# Altium footprint library Other.PcbLib: 104 footprints (part 4 of 7)
Each footprint in its own frame and in the unit in brackets; x right, y up, seen from the top. Pads: shape width x height; smd on the part's side, far side on the other; paste and mask are expansions set on the pad; w line width, h text height; cw(c..) or ccw(c..) is an arc to the next point about the centre after c.
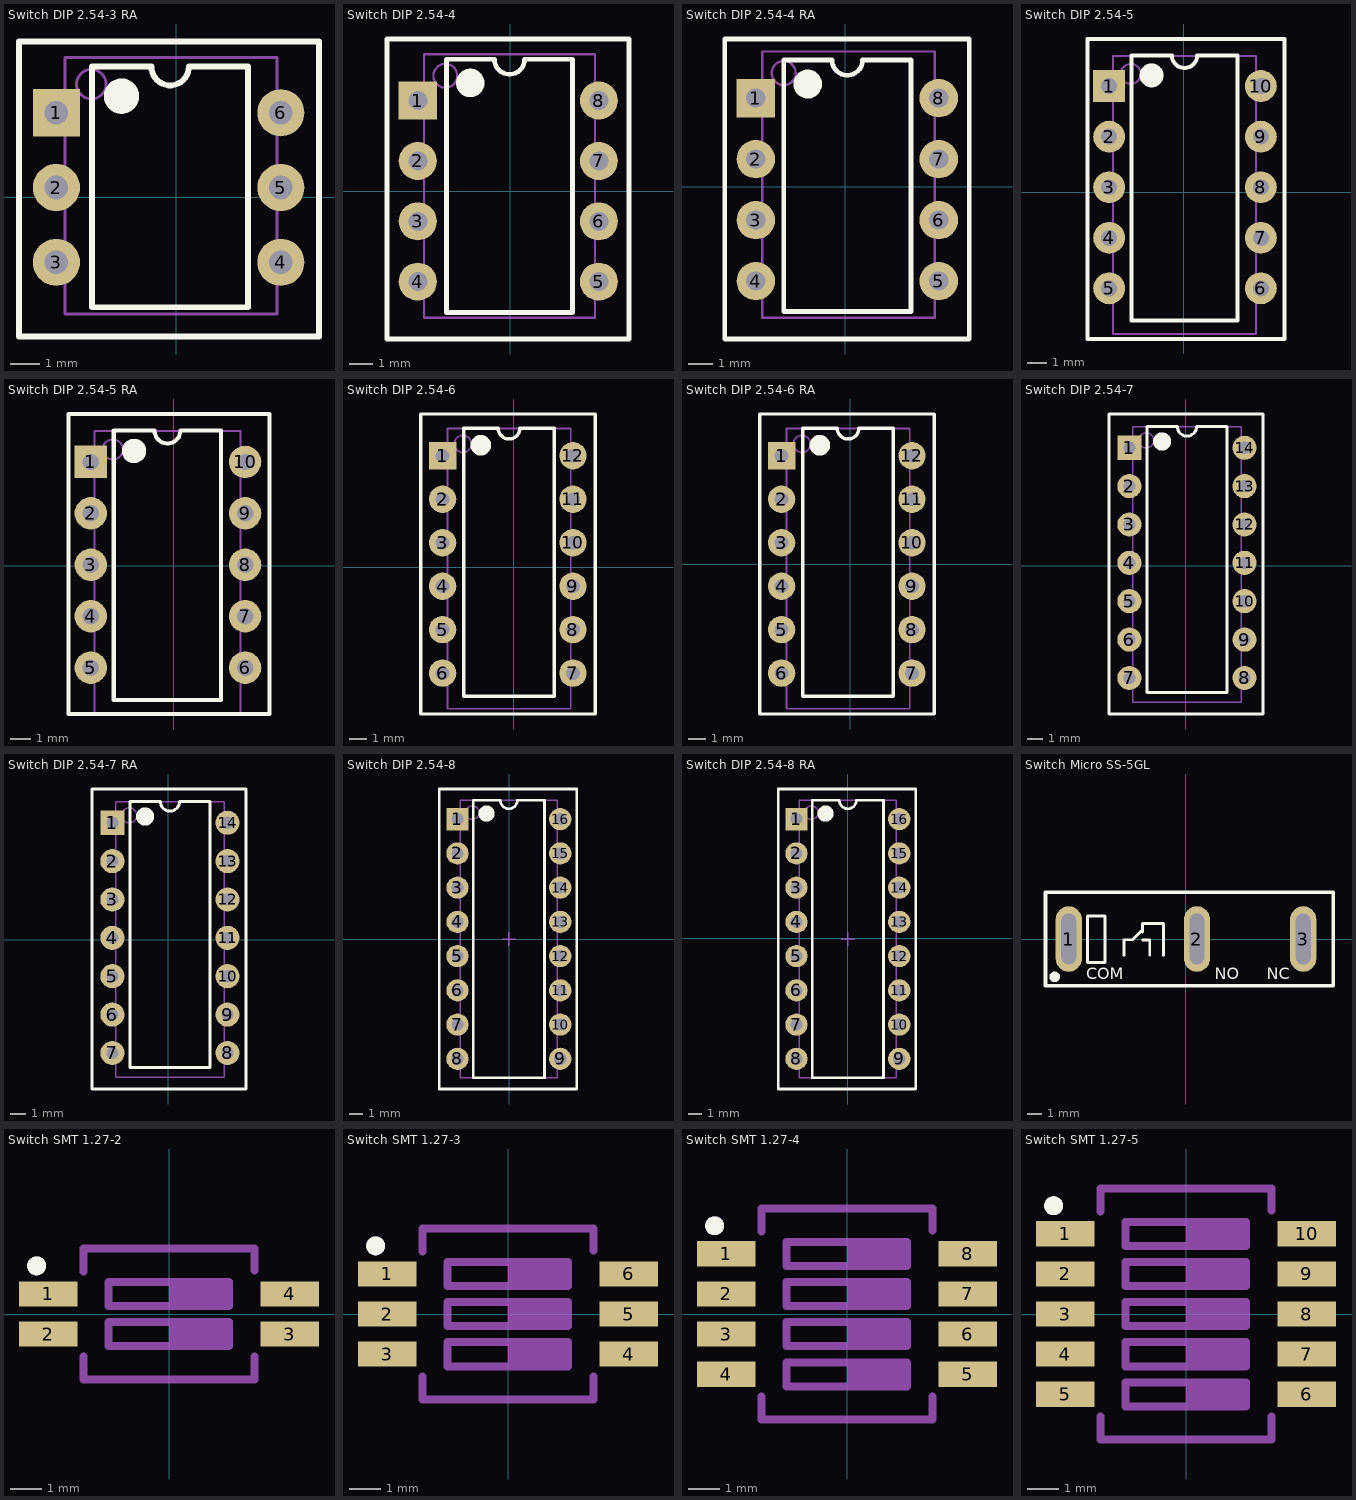
[diagram p3: the footprints below, top view; thin cyan lines are the x and y axes]

## Switch DIP 2.54-3 RA [mm] "3位拨码开关"
pads (6):
  rect 1.6x1.6 hole 0.8: 1(-4.064,2.87)
  round 1.6 hole 0.8: 2(-4.064,0.33) 3(-4.064,-2.21) 4(3.556,-2.21) 5(3.556,0.33) 6(3.556,2.87)
Top Overlay:
  circle w0.6: c-1.853,3.433 r0.3
  lines w0.2: -2.853,-3.734 -2.853,4.433 -0.838,4.433 ccw(c-0.203,4.433) 0.432,4.433 2.447,4.433 2.447,-3.734 -2.853,-3.734
  lines w0.203: -5.334,-4.496 -5.334,5.283 4.851,5.283 4.851,-4.496 ; -5.334,-4.445 -5.334,-4.724 4.851,-4.724 4.851,-3.886
Mechanical 13:
  circle w0.1: c-2.878,3.838 r0.5
  lines w0.1: -3.778,-3.962 -3.778,4.738 3.422,4.738 3.422,-3.962 -3.778,-3.962
3D body "User Library-DIP SW 3P TH RA.step": height 7.9, standoff -3.8, extent -6.258,-4.57 4.661,5.23

## Switch DIP 2.54-4 [mm] "2位拨码开关"
pads (8):
  rect 1.6x1.6 hole 0.8: 1(-3.886,3.81)
  round 1.6 hole 0.8: 2(-3.886,1.27) 3(-3.886,-1.27) 4(-3.886,-3.81) 5(3.734,-3.81) 6(3.734,-1.27) 7(3.734,1.27) 8(3.734,3.81)
Top Overlay:
  circle w0.6: c-1.675,4.55 r0.3
  lines w0.2: -2.675,-5.105 -2.675,5.55 -0.66,5.55 ccw(c-0.025,5.55) 0.61,5.55 2.625,5.55 2.625,-5.105 -2.675,-5.105
  lines w0.203: -5.182,-3.48 -5.182,6.401 5.004,6.401 5.004,-3.48 ; -5.182,-3.429 -5.182,-6.223 5.004,-6.223 5.004,-2.87
Mechanical 13:
  circle w0.1: c-2.725,4.854 r0.5
  lines w0.1: -3.625,-5.334 -3.625,5.754 3.575,5.754 3.575,-5.334 -3.625,-5.334
3D body "User Library-DIP SW 4P TH.step": height 8.5, standoff -3.8, extent -4.966,-6.159 4.814,6.261

## Switch DIP 2.54-4 RA [mm] "4位拨码开关"
pads (8):
  rect 1.6x1.6 hole 0.8: 1(-3.734,3.683)
  round 1.6 hole 0.8: 2(-3.734,1.143) 3(-3.734,-1.397) 4(-3.734,-3.937) 5(3.886,-3.937) 6(3.886,-1.397) 7(3.886,1.143) 8(3.886,3.683)
Top Overlay:
  circle w0.6: c-1.574,4.271 r0.3
  lines w0.2: -2.574,-5.207 2.726,-5.207 2.726,5.271 0.711,5.271 cw(c0.076,5.271) -0.559,5.271 -2.574,5.271 -2.574,-5.207
  lines w0.203: -5.029,-3.607 -5.029,6.147 5.156,6.147 5.156,-3.607 ; -5.029,-3.556 -5.029,-6.35 5.156,-6.35 5.156,-2.997
Mechanical 13:
  circle w0.1: c-2.573,4.727 r0.5
  lines w0.1: -3.473,-5.461 3.727,-5.461 3.727,5.627 -3.473,5.627 -3.473,-5.461
3D body "User Library-DIP SW 4P TH RA.step": height 7.9, standoff -3.8, extent -5.954,-6.297 4.966,6.043

## Switch DIP 2.54-5 [mm] "2位拨码开关"
pads (10):
  rect 1.6x1.6 hole 0.8: 1(-3.759,5.334)
  round 1.6 hole 0.8: 2(-3.759,2.794) 3(-3.759,0.254) 4(-3.759,-2.286) 5(-3.759,-4.826) 6(3.861,-4.826) 7(3.861,-2.286) 8(3.861,0.254) 9(3.861,2.794) 10(3.861,5.334)
Top Overlay:
  circle w0.6: c-1.625,5.871 r0.3
  lines w0.2: -2.625,-6.426 -2.625,6.871 -0.61,6.871 ccw(c0.025,6.871) 0.66,6.871 2.675,6.871 2.675,-6.426 -2.625,-6.426
  lines w0.203: 5.055,-2.388 5.055,7.696 -4.851,7.696 -4.851,-7.366 5.055,-7.366 5.055,-1.778
Mechanical 13:
  circle w0.1: c-2.675,5.946 r0.5
  lines w0.1: -3.575,-7.112 -3.575,6.846 3.625,6.846 3.625,-7.112 -3.575,-7.112
3D body "User Library-DIP SW 5P TH.step": height 8.5, standoff -3.8, extent -4.814,-7.302 4.966,7.658

## Switch DIP 2.54-5 RA [mm] "5位拨码开关"
pads (10):
  rect 1.6x1.6 hole 0.8: 1(-4.089,5.131)
  round 1.6 hole 0.8: 2(-4.089,2.591) 3(-4.089,0.051) 4(-4.089,-2.489) 5(-4.089,-5.029) 6(3.531,-5.029) 7(3.531,-2.489) 8(3.531,0.051) 9(3.531,2.591) 10(3.531,5.131)
Top Overlay:
  circle w0.6: c-1.955,5.668 r0.3
  lines w0.2: -2.955,-6.629 2.345,-6.629 2.345,6.668 0.33,6.668 cw(c-0.305,6.668) -0.94,6.668 -2.955,6.668 -2.955,-6.629
  lines w0.203: 4.724,-2.591 4.724,7.493 -5.182,7.493 -5.182,-7.313 4.724,-7.313 4.724,-1.981
Mechanical 13:
  circle w0.1: c-3.005,5.743 r0.5
  lines w0.1: -3.905,-7.315 3.295,-7.315 3.295,6.643 -3.905,6.643 -3.905,-7.315
3D body "User Library-DIP SW 5P TH RA.step": height 7.9, standoff -3.8, extent -6.335,-7.313 4.585,7.567

## Switch DIP 2.54-6 [mm] "2位拨码开关"
pads (12):
  rect 1.6x1.6 hole 0.8: 1(-4.166,6.502)
  round 1.6 hole 0.8: 2(-4.166,3.962) 3(-4.166,1.422) 4(-4.166,-1.118) 5(-4.166,-3.658) 6(-4.166,-6.198) 7(3.454,-6.198) 8(3.454,-3.658) 9(3.454,-1.118) 10(3.454,1.422) 11(3.454,3.962) 12(3.454,6.502)
Top Overlay:
  circle w0.6: c-1.929,7.116 r0.3
  lines w0.2: -2.929,-7.544 -2.929,8.116 -0.914,8.116 ccw(c-0.279,8.116) 0.356,8.116 2.371,8.116 2.371,-7.544 -2.929,-7.544
  lines w0.203: -5.436,-1.143 -5.436,8.941 4.75,8.941 4.75,-1.143 ; -5.436,-1.092 -5.436,-8.585 4.75,-8.585 4.75,-0.533
Mechanical 13:
  circle w0.1: c-2.979,7.191 r0.5
  lines w0.1: -3.879,-8.28 -3.879,8.091 3.321,8.091 3.321,-8.28 -3.879,-8.28
3D body "User Library-DIP SW 6P TH.step": height 8.5, standoff -3.8, extent -5.246,-8.598 4.534,8.902

## Switch DIP 2.54-6 RA [mm] "6位拨码开关"
pads (12):
  rect 1.6x1.6 hole 0.8: 1(-4.013,6.325)
  round 1.6 hole 0.8: 2(-4.013,3.785) 3(-4.013,1.245) 4(-4.013,-1.295) 5(-4.013,-3.835) 6(-4.013,-6.375) 7(3.607,-6.375) 8(3.607,-3.835) 9(3.607,-1.295) 10(3.607,1.245) 11(3.607,3.785) 12(3.607,6.325)
Top Overlay:
  circle w0.6: c-1.777,6.938 r0.3
  lines w0.2: -2.777,-7.722 2.523,-7.722 2.523,7.938 0.508,7.938 cw(c-0.127,7.938) -0.762,7.938 -2.777,7.938 -2.777,-7.722
  lines w0.203: -5.283,-1.321 -5.283,8.763 4.902,8.763 4.902,-1.321 ; -5.283,-1.27 -5.283,-8.763 4.902,-8.763 4.902,-0.711
Mechanical 13:
  circle w0.1: c-2.827,7.013 r0.5
  lines w0.1: -3.727,-8.458 3.473,-8.458 3.473,7.913 -3.727,7.913 -3.727,-8.458
3D body "User Library-DIP SW 6P TH RA.step": height 7.9, standoff -3.8, extent -6.233,-8.71 4.687,8.71

## Switch DIP 2.54-7 [mm] "2位拨码开关"
pads (14):
  rect 1.6x1.6 hole 0.8: 1(-3.734,7.823)
  round 1.6 hole 0.8: 2(-3.734,5.283) 3(-3.734,2.743) 4(-3.734,0.203) 5(-3.734,-2.337) 6(-3.734,-4.877) 7(-3.734,-7.417) 8(3.886,-7.417) 9(3.886,-4.877) 10(3.886,-2.337) 11(3.886,0.203) 12(3.886,2.743) 13(3.886,5.283) 14(3.886,7.823)
Top Overlay:
  circle w0.6: c-1.574,8.233 r0.3
  lines w0.2: -2.574,-8.382 -2.574,9.233 -0.559,9.233 ccw(c0.076,9.233) 0.711,9.233 2.726,9.233 2.726,-8.382 -2.574,-8.382
  lines w0.203: -5.08,-0.025 -5.08,10.058 5.105,10.058 5.105,-0.025 ; -5.08,0.025 -5.08,-9.804 5.105,-9.804 5.105,0.584
Mechanical 13:
  circle w0.1: c-2.624,8.308 r0.5
  lines w0.1: -3.524,-9.042 -3.524,9.208 3.676,9.208 3.676,-9.042 -3.524,-9.042
3D body "User Library-DIP SW 7P TH.step": height 8.5, standoff -3.8, extent -4.788,-9.791 4.992,10.249

## Switch DIP 2.54-7 RA [mm] "7位拨码开关"
pads (14):
  rect 1.6x1.6 hole 0.8: 1(-3.683,7.747)
  round 1.6 hole 0.8: 2(-3.683,5.207) 3(-3.683,2.667) 4(-3.683,0.127) 5(-3.683,-2.413) 6(-3.683,-4.953) 7(-3.683,-7.493) 8(3.937,-7.493) 9(3.937,-4.953) 10(3.937,-2.413) 11(3.937,0.127) 12(3.937,2.667) 13(3.937,5.207) 14(3.937,7.747)
Top Overlay:
  circle w0.6: c-1.523,8.157 r0.3
  lines w0.2: -2.523,-8.458 2.777,-8.458 2.777,9.157 0.762,9.157 cw(c0.127,9.157) -0.508,9.157 -2.523,9.157 -2.523,-8.458
  lines w0.203: -5.029,-0.102 -5.029,9.982 5.156,9.982 5.156,-0.102 ; -5.029,-0.051 -5.029,-9.881 5.156,-9.881 5.156,0.508
Mechanical 13:
  circle w0.1: c-2.573,8.232 r0.5
  lines w0.1: -3.473,-9.119 3.727,-9.119 3.727,9.132 -3.473,9.132 -3.473,-9.119
3D body "User Library-DIP SW 7P TH RA.step": height 7.9, standoff -3.8, extent -5.903,-9.878 5.017,10.082

## Switch DIP 2.54-8 [mm] "2位拨码开关"
pads (16):
  rect 1.65x1.65 hole 0.9: 1(-3.847,8.915)
  round 1.65 hole 0.9: 2(-3.847,6.375) 3(-3.847,3.835) 4(-3.847,1.295) 5(-3.847,-1.245) 6(-3.847,-3.785) 7(-3.847,-6.325) 8(-3.847,-8.865) 9(3.773,-8.865) 10(3.773,-6.325) 11(3.773,-3.785) 12(3.773,-1.245) 13(3.773,1.295) 14(3.773,3.835) 15(3.773,6.375) 16(3.773,8.915)
Top Overlay:
  circle w0.6: c-1.687,9.325 r0.3
  lines w0.2: -2.687,-10.275 -2.687,10.325 -0.672,10.325 ccw(c-0.037,10.325) 0.598,10.325 2.613,10.325 2.613,-10.275 -2.687,-10.275
  lines w0.203: -5.194,1.067 -5.194,11.151 4.992,11.151 4.992,1.067 ; -5.194,1.118 -5.194,-11.1 4.966,-11.1 4.992,-11.074 4.992,-10.363 4.992,1.676
Mechanical 13:
  circle w0.1: c-2.737,9.4 r0.5
  lines w0.1: -3.637,-10.25 -3.637,10.3 3.563,10.3 3.563,-10.25 -3.637,-10.25
Mechanical 15:
  lines w0.1: -0.537,0.025 0.463,0.025 ; -0.037,-0.475 -0.037,0.525
3D body "User Library-DIP SW 8P TH.step": height 8.5, standoff -3.8, extent -4.915,-11.29 4.865,11.29

## Switch DIP 2.54-8 RA [mm] "8位拨码开关"
pads (16):
  rect 1.65x1.65 hole 0.9: 1(-3.785,8.839)
  round 1.65 hole 0.9: 2(-3.785,6.299) 3(-3.785,3.759) 4(-3.785,1.219) 5(-3.785,-1.321) 6(-3.785,-3.861) 7(-3.785,-6.401) 8(-3.785,-8.941) 9(3.835,-8.941) 10(3.835,-6.401) 11(3.835,-3.861) 12(3.835,-1.321) 13(3.835,1.219) 14(3.835,3.759) 15(3.835,6.299) 16(3.835,8.839)
Top Overlay:
  circle w0.6: c-1.625,9.249 r0.3
  lines w0.2: -2.625,-10.351 2.675,-10.351 2.675,10.249 0.66,10.249 cw(c0.025,10.249) -0.61,10.249 -2.625,10.249 -2.625,-10.351
  lines w0.203: -5.131,0.991 -5.131,11.074 5.055,11.074 5.055,0.991 ; -5.131,1.041 -5.131,-11.176 5.029,-11.176 5.055,-11.151 5.055,-10.439 5.055,1.6
Mechanical 13:
  circle w0.1: c-2.675,9.324 r0.5
  lines w0.1: -3.575,-10.326 3.625,-10.326 3.625,10.224 -3.575,10.224 -3.575,-10.326
Mechanical 15:
  lines w0.1: -0.475,-0.051 0.525,-0.051 ; 0.025,-0.551 0.025,0.449
3D body "User Library-DIP SW 8P TH RA.step": height 7.9, standoff -3.8, extent -5.979,-11.301 4.941,11.199

## Switch Micro SS-5GL [mm] "微动限位开关"
pads (3):
  oval 1.8x4.5 hole 1 slot 3.5 at 90 deg: 1(-8.05,0) 2(0.75,0) 3(8.05,0)
Top Overlay:
  circle w0.36: c-9.017,-2.603 r0.18
  lines w0.2: -4.265,-1.118 -4.265,-0.051 -3.681,-0.051 -2.995,0.635 ; -2.995,0.483 -2.995,1.067 -1.548,1.067 -1.548,-1.118 ; -2.97,-0.076 -2.487,-0.076 -2.487,-1.118
  lines w0.203: -6.755,-1.6 -6.755,1.575 -5.561,1.575 -5.561,-1.6 -6.755,-1.6
  lines w0.254: -9.65,-3.2 -9.65,3.2 10.106,3.2 10.106,-3.2 -9.65,-3.2
  text "COM" at -6.856,-2.769 h0.8
  text "NO" at 1.958,-2.769 h0.8
  text "NC" at 5.539,-2.769 h0.8
3D body "微动限位开关Switch,hinge lever,solder term,50g.stp": height 16.6, standoff -3.4, extent -9.672,-3.2 10.128,3.2

## Switch SMT 1.27-2 [mm] "2位拨码开关"
pads (4):
  rect 1.85x0.8 smd: 1(-3.825,0.635) 2(-3.825,-0.635) 3(3.825,-0.635) 4(3.825,0.635)
Top Overlay:
  circle w0.3: c-4.191,1.524 r0.15
Mechanical 15:
  circle w0.3: c-4.191,1.524 r0.15
  region: 0.119,1.012 0.119,0.25 1.897,0.25 1.897,1.012
  region: 0.119,-0.258 0.119,-1.02 1.897,-1.02 1.897,-0.258
  lines w0.254: -2.7,-1.346 -2.7,-2.07 2.7,-2.07 2.7,-1.346 ; -2.7,1.346 -2.7,2.07 2.7,2.07 2.7,1.372 ; 0.119,-0.893 0.119,-0.258 ; 0.119,0.25 0.119,1.012 ; -1.913,-1.02 1.897,-1.02 1.897,-0.258 -1.913,-0.258 -1.913,-1.02 ; -1.913,0.25 1.897,0.25 1.897,1.012 -1.913,1.012 -1.913,0.25
3D body: height 2.31, standoff 0.2, extent -1.341,0.398 -0.807,0.881
3D body: height 2.31, standoff 0.2, extent -1.341,-0.872 -0.807,-0.389
3D body: height 0.7, standoff 0.5, extent -3.683,0.441 -2.7,0.829
3D body: height 2.3, standoff 0.1, extent -2.7,-2.07 2.7,2.07
3D body: height 0.7, standoff 0, extent -3.683,0.441 -3.48,0.829
3D body: height 0.2, standoff 0, extent -4.302,0.441 -3.48,0.829
3D body: height 0.2, standoff 0, extent -4.302,-0.829 -3.48,-0.441
3D body: height 0.7, standoff 0, extent -3.683,-0.829 -3.48,-0.441
3D body: height 0.7, standoff 0.5, extent -3.683,-0.829 -2.7,-0.441
3D body: height 0.2, standoff 0, extent 3.472,0.441 4.294,0.829
3D body: height 0.7, standoff 0, extent 3.472,0.441 3.675,0.829
3D body: height 0.7, standoff 0.5, extent 2.692,0.451 3.675,0.838
3D body: height 0.2, standoff 0, extent 3.472,-0.829 4.294,-0.441
3D body: height 0.7, standoff 0, extent 3.472,-0.829 3.675,-0.441
3D body: height 0.7, standoff 0.5, extent 2.692,-0.829 3.675,-0.441

## Switch SMT 1.27-3 [mm] "3位拨码开关"
pads (6):
  rect 1.85x0.8 smd: 1(-3.825,1.27) 2(-3.825,0) 3(-3.825,-1.27) 4(3.825,-1.27) 5(3.825,0) 6(3.825,1.27)
Top Overlay:
  circle w0.3: c-4.191,2.159 r0.15
Mechanical 15:
  circle w0.3: c-4.191,2.159 r0.15
  region: 0.119,1.647 0.119,0.885 1.897,0.885 1.897,1.647
  region: 0.119,0.377 0.119,-0.385 1.897,-0.385 1.897,0.377
  region: 0.119,-0.893 0.119,-1.655 1.897,-1.655 1.897,-0.893
  lines w0.254: -2.7,-1.981 -2.7,-2.705 2.7,-2.705 2.7,-1.981 ; -2.7,1.981 -2.7,2.705 2.7,2.705 2.7,2.007 ; 0.119,-1.528 0.119,-0.893 ; 0.119,-0.258 0.119,0.377 ; 0.119,0.885 0.119,1.647 ; -1.913,-1.655 -1.913,-0.893 1.897,-0.893 1.897,-1.655 -1.913,-1.655 ; -1.913,-0.385 1.897,-0.385 1.897,0.377 -1.913,0.377 -1.913,-0.385 ; -1.913,0.885 1.897,0.885 1.897,1.647 -1.913,1.647 -1.913,0.885
3D body: height 2.31, standoff 0.2, extent -1.341,1.033 -0.807,1.516
3D body: height 2.31, standoff 0.2, extent -1.341,-0.237 -0.807,0.246
3D body: height 0.7, standoff 0.5, extent -3.683,1.076 -2.7,1.464
3D body: height 2.3, standoff 0.1, extent -2.7,-2.705 2.7,2.705
3D body: height 0.7, standoff 0, extent -3.683,1.076 -3.48,1.464
3D body: height 0.2, standoff 0, extent -4.302,1.076 -3.48,1.464
3D body: height 0.2, standoff 0, extent -4.302,-0.194 -3.48,0.194
3D body: height 0.7, standoff 0, extent -3.683,-0.194 -3.48,0.194
3D body: height 0.7, standoff 0.5, extent -3.683,-0.194 -2.7,0.194
3D body: height 0.2, standoff 0, extent 3.472,1.076 4.294,1.464
3D body: height 0.7, standoff 0, extent 3.472,1.076 3.675,1.464
3D body: height 0.7, standoff 0.5, extent 2.692,1.086 3.675,1.473
3D body: height 0.2, standoff 0, extent 3.472,-0.194 4.294,0.194
3D body: height 0.7, standoff 0, extent 3.472,-0.194 3.675,0.194
3D body: height 0.7, standoff 0.5, extent 2.692,-0.194 3.675,0.194
3D body: height 0.7, standoff 0.5, extent 2.692,-1.464 3.675,-1.076
3D body: height 0.7, standoff 0, extent 3.472,-1.464 3.675,-1.076
3D body: height 0.2, standoff 0, extent 3.472,-1.464 4.294,-1.076
3D body: height 0.7, standoff 0.5, extent -3.683,-1.464 -2.7,-1.076
3D body: height 0.7, standoff 0, extent -3.683,-1.464 -3.48,-1.076
3D body: height 0.2, standoff 0, extent -4.302,-1.464 -3.48,-1.076
3D body: height 2.31, standoff 0.2, extent -1.341,-1.507 -0.807,-1.024

## Switch SMT 1.27-4 [mm] "4位拨码开关"
pads (8):
  rect 1.85x0.8 smd: 1(-3.825,1.905) 2(-3.825,0.635) 3(-3.825,-0.635) 4(-3.825,-1.905) 5(3.825,-1.905) 6(3.825,-0.635) 7(3.825,0.635) 8(3.825,1.905)
Top Overlay:
  circle w0.3: c-4.191,2.794 r0.15
Mechanical 15:
  circle w0.3: c-4.191,2.794 r0.15
  region: 0.119,2.282 0.119,1.52 1.897,1.52 1.897,2.282
  region: 0.119,1.012 0.119,0.25 1.897,0.25 1.897,1.012
  region: 0.119,-0.258 0.119,-1.02 1.897,-1.02 1.897,-0.258
  region: 0.119,-1.528 0.119,-2.29 1.897,-2.29 1.897,-1.528
  lines w0.254: -2.7,-2.616 -2.7,-3.34 2.7,-3.34 2.7,-2.616 ; -2.7,2.616 -2.7,3.34 2.7,3.34 2.7,2.642 ; 0.119,-2.163 0.119,-1.528 ; 0.119,-0.893 0.119,-0.258 ; 0.119,0.377 0.119,1.012 ; 0.119,1.52 0.119,2.282 ; -1.913,-2.29 1.897,-2.29 1.897,-1.528 -1.913,-1.528 -1.913,-2.29 ; -1.913,-1.02 -1.913,-0.258 1.897,-0.258 1.897,-1.02 -1.913,-1.02 ; -1.913,0.25 1.897,0.25 1.897,1.012 -1.913,1.012 -1.913,0.25 ; -1.913,1.52 1.897,1.52 1.897,2.282 -1.913,2.282 -1.913,1.52
3D body: height 2.31, standoff 0.2, extent -1.341,1.668 -0.807,2.151
3D body: height 2.31, standoff 0.2, extent -1.341,0.398 -0.807,0.881
3D body: height 0.7, standoff 0.5, extent -3.683,1.711 -2.7,2.099
3D body: height 2.3, standoff 0.1, extent -2.7,-3.34 2.7,3.34
3D body: height 0.7, standoff 0, extent -3.683,1.711 -3.48,2.099
3D body: height 0.2, standoff 0, extent -4.302,1.711 -3.48,2.099
3D body: height 0.2, standoff 0, extent -4.302,0.441 -3.48,0.829
3D body: height 0.7, standoff 0, extent -3.683,0.441 -3.48,0.829
3D body: height 0.7, standoff 0.5, extent -3.683,0.441 -2.7,0.829
3D body: height 0.2, standoff 0, extent 3.472,1.711 4.294,2.099
3D body: height 0.7, standoff 0, extent 3.472,1.711 3.675,2.099
3D body: height 0.7, standoff 0.5, extent 2.692,1.721 3.675,2.108
3D body: height 0.2, standoff 0, extent 3.472,0.441 4.294,0.829
3D body: height 0.7, standoff 0, extent 3.472,0.441 3.675,0.829
3D body: height 0.7, standoff 0.5, extent 2.692,0.441 3.675,0.829
3D body: height 0.7, standoff 0.5, extent 2.692,-0.829 3.675,-0.441
3D body: height 0.7, standoff 0, extent 3.472,-0.829 3.675,-0.441
3D body: height 0.2, standoff 0, extent 3.472,-0.829 4.294,-0.441
3D body: height 0.7, standoff 0.5, extent -3.683,-0.829 -2.7,-0.441
3D body: height 0.7, standoff 0, extent -3.683,-0.829 -3.48,-0.441
3D body: height 0.2, standoff 0, extent -4.302,-0.829 -3.48,-0.441
3D body: height 2.31, standoff 0.2, extent -1.341,-0.872 -0.807,-0.389
3D body: height 2.31, standoff 0.2, extent -1.341,-2.142 -0.807,-1.659
3D body: height 0.2, standoff 0, extent -4.302,-2.099 -3.48,-1.711
3D body: height 0.7, standoff 0, extent -3.683,-2.099 -3.48,-1.711
3D body: height 0.7, standoff 0.5, extent -3.683,-2.099 -2.7,-1.711
3D body: height 0.2, standoff 0, extent 3.472,-2.099 4.294,-1.711
3D body: height 0.7, standoff 0, extent 3.472,-2.099 3.675,-1.711
3D body: height 0.7, standoff 0.5, extent 2.692,-2.099 3.675,-1.711

## Switch SMT 1.27-5 [mm] "5位拨码开关"
pads (10):
  rect 1.85x0.8 smd: 1(-3.825,2.54) 2(-3.825,1.27) 3(-3.825,0) 4(-3.825,-1.27) 5(-3.825,-2.54) 6(3.825,-2.54) 7(3.825,-1.27) 8(3.825,0) 9(3.825,1.27) 10(3.825,2.54)
Top Overlay:
  circle w0.3: c-4.191,3.429 r0.15
Mechanical 15:
  circle w0.3: c-4.191,3.429 r0.15
  region: 0.119,-2.163 0.119,-2.925 1.897,-2.925 1.897,-2.163
  region: 0.119,2.917 0.119,2.155 1.897,2.155 1.897,2.917
  region: 0.119,1.647 0.119,0.885 1.897,0.885 1.897,1.647
  region: 0.119,0.377 0.119,-0.385 1.897,-0.385 1.897,0.377
  region: 0.119,-0.893 0.119,-1.655 1.897,-1.655 1.897,-0.893
  lines w0.254: -2.7,-3.251 -2.7,-3.975 2.7,-3.975 2.7,-3.251 ; -2.7,3.251 -2.7,3.975 2.7,3.975 2.7,3.277 ; 0.119,-2.798 0.119,-2.163 ; 0.119,-1.528 0.119,-0.893 ; 0.119,-0.258 0.119,0.377 ; 0.119,1.012 0.119,1.647 ; 0.119,2.155 0.119,2.917 ; -1.913,-2.925 -1.913,-2.163 1.897,-2.163 1.897,-2.925 -1.913,-2.925 ; -1.913,-1.655 1.897,-1.655 1.897,-0.893 -1.913,-0.893 -1.913,-1.655 ; -1.913,-0.385 -1.913,0.377 1.897,0.377 1.897,-0.385 -1.913,-0.385 ; -1.913,0.885 1.897,0.885 1.897,1.647 -1.913,1.647 -1.913,0.885 ; -1.913,2.155 1.897,2.155 1.897,2.917 -1.913,2.917 -1.913,2.155
3D body: height 0.7, standoff 0.5, extent 2.692,-2.734 3.675,-2.346
3D body: height 0.7, standoff 0, extent 3.472,-2.734 3.675,-2.346
3D body: height 0.2, standoff 0, extent 3.472,-2.734 4.294,-2.346
3D body: height 0.7, standoff 0.5, extent -3.683,-2.734 -2.7,-2.346
3D body: height 0.7, standoff 0, extent -3.683,-2.734 -3.48,-2.346
3D body: height 0.2, standoff 0, extent -4.302,-2.734 -3.48,-2.346
3D body: height 2.31, standoff 0.2, extent -1.341,-2.777 -0.807,-2.294
3D body: height 2.31, standoff 0.2, extent -1.341,2.303 -0.807,2.786
3D body: height 2.31, standoff 0.2, extent -1.341,1.033 -0.807,1.516
3D body: height 0.7, standoff 0.5, extent -3.683,2.346 -2.7,2.734
3D body: height 2.3, standoff 0.1, extent -2.7,-3.988 2.7,3.975
3D body: height 0.7, standoff 0, extent -3.683,2.346 -3.48,2.734
3D body: height 0.2, standoff 0, extent -4.302,2.346 -3.48,2.734
3D body: height 0.2, standoff 0, extent -4.302,1.076 -3.48,1.464
3D body: height 0.7, standoff 0, extent -3.683,1.076 -3.48,1.464
3D body: height 0.7, standoff 0.5, extent -3.683,1.076 -2.7,1.464
3D body: height 0.2, standoff 0, extent 3.472,2.346 4.294,2.734
3D body: height 0.7, standoff 0, extent 3.472,2.346 3.675,2.734
3D body: height 0.7, standoff 0.5, extent 2.692,2.356 3.675,2.743
3D body: height 0.2, standoff 0, extent 3.472,1.076 4.294,1.464
3D body: height 0.7, standoff 0, extent 3.472,1.076 3.675,1.464
3D body: height 0.7, standoff 0.5, extent 2.692,1.076 3.675,1.464
3D body: height 0.7, standoff 0.5, extent 2.692,-0.194 3.675,0.194
3D body: height 0.7, standoff 0, extent 3.472,-0.194 3.675,0.194
3D body: height 0.2, standoff 0, extent 3.472,-0.194 4.294,0.194
3D body: height 0.7, standoff 0.5, extent -3.683,-0.194 -2.7,0.194
3D body: height 0.7, standoff 0, extent -3.683,-0.194 -3.48,0.194
3D body: height 0.2, standoff 0, extent -4.302,-0.194 -3.48,0.194
3D body: height 2.31, standoff 0.2, extent -1.341,-0.237 -0.807,0.246
3D body: height 2.31, standoff 0.2, extent -1.341,-1.507 -0.807,-1.024
3D body: height 0.2, standoff 0, extent -4.302,-1.464 -3.48,-1.076
3D body: height 0.7, standoff 0, extent -3.683,-1.464 -3.48,-1.076
3D body: height 0.7, standoff 0.5, extent -3.683,-1.464 -2.7,-1.076
3D body: height 0.2, standoff 0, extent 3.472,-1.464 4.294,-1.076
3D body: height 0.7, standoff 0, extent 3.472,-1.464 3.675,-1.076
3D body: height 0.7, standoff 0.5, extent 2.692,-1.464 3.675,-1.076